# Altium footprint library SMDLibrary.PcbLib: 309 footprints (part 2 of 20)
Each footprint in its own frame and in the unit in brackets; x right, y up, seen from the top. Pads: shape width x height; smd on the part's side, far side on the other; paste and mask are expansions set on the pad; w line width, h text height; cw(c..) or ccw(c..) is an arc to the next point about the centre after c.
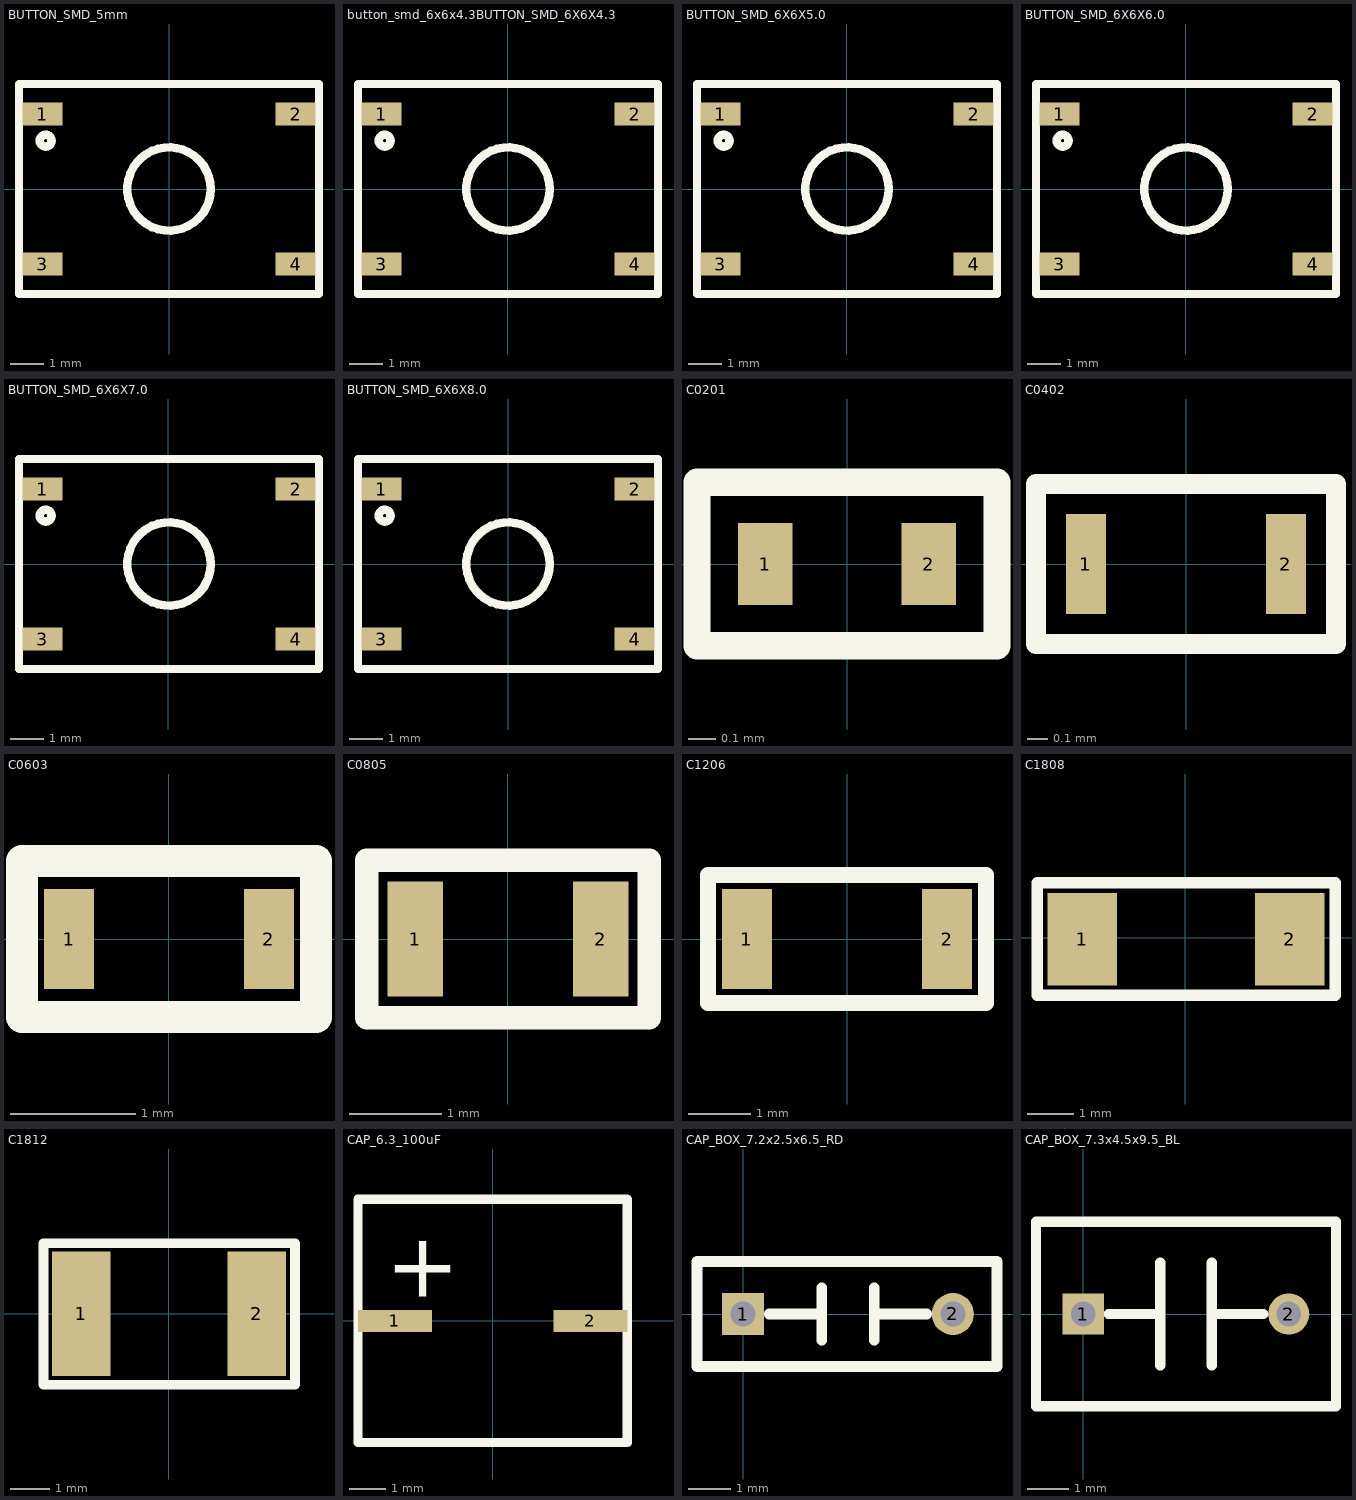
[diagram p1: the footprints below, top view; thin cyan lines are the x and y axes]

## BUTTON_SMD_5mm [mm]
pads (4):
  rect 1.2x0.7 smd: 1(-3.8,2.25) 2(3.8,2.25) 3(-3.8,-2.25) 4(3.8,-2.25)
Top Overlay:
  circle w0.254: c-3.7,1.45 r0.177
  circle w0.254: c0,0 r1.25
  lines w0.254: -4.5,-3.15 -4.5,3.15 4.5,3.15 4.5,-3.15 -4.5,-3.15
3D body "button_smd_6x6x4.3.stp": height 4.3, standoff 0, extent -4,-3 4,3

## button_smd_6x6x4.3BUTTON_SMD_6X6X4.3 [mm]
pads (4):
  rect 1.2x0.7 smd: 1(-3.8,2.25) 2(3.8,2.25) 3(-3.8,-2.25) 4(3.8,-2.25)
Top Overlay:
  circle w0.254: c-3.7,1.45 r0.177
  circle w0.254: c0,0 r1.25
  lines w0.254: -4.5,-3.15 -4.5,3.15 4.5,3.15 4.5,-3.15 -4.5,-3.15
3D body "button_smd_6x6x4.3.stp": height 4.3, standoff 0, extent -4,-3 4,3

## BUTTON_SMD_6X6X5.0 [mm]
pads (4):
  rect 1.2x0.7 smd: 1(-3.8,2.25) 2(3.8,2.25) 3(-3.8,-2.25) 4(3.8,-2.25)
Top Overlay:
  circle w0.254: c0,0 r1.25
  circle w0.254: c-3.7,1.45 r0.177
  lines w0.254: -4.5,-3.15 4.5,-3.15 4.5,3.15 -4.5,3.15 -4.5,-3.15
3D body "button_smd_6x6x5.0.stp": height 5, standoff 0, extent -4,-3 4,3

## BUTTON_SMD_6X6X6.0 [mm]
pads (4):
  rect 1.2x0.7 smd: 1(-3.8,2.25) 2(3.8,2.25) 3(-3.8,-2.25) 4(3.8,-2.25)
Top Overlay:
  circle w0.254: c0,0 r1.25
  circle w0.254: c-3.7,1.45 r0.177
  lines w0.254: -4.5,-3.15 4.5,-3.15 4.5,3.15 -4.5,3.15 -4.5,-3.15
3D body "button_smd_6x6x6.0.stp": height 6, standoff 0, extent -4.025,-3 3.975,3

## BUTTON_SMD_6X6X7.0 [mm]
pads (4):
  rect 1.2x0.7 smd: 1(-3.775,2.25) 2(3.825,2.25) 3(-3.775,-2.25) 4(3.825,-2.25)
Top Overlay:
  circle w0.254: c0.025,0 r1.25
  circle w0.254: c-3.675,1.45 r0.177
  lines w0.254: -4.475,-3.15 4.525,-3.15 4.525,3.15 -4.475,3.15 -4.475,-3.15
3D body "button_smd_6x6x7.0.stp": height 7, standoff 0, extent -3.975,-3.025 4.025,2.975

## BUTTON_SMD_6X6X8.0 [mm]
pads (4):
  rect 1.2x0.7 smd: 1(-3.8,2.25) 2(3.8,2.25) 3(-3.8,-2.25) 4(3.8,-2.25)
Top Overlay:
  circle w0.254: c0,0 r1.25
  circle w0.254: c-3.7,1.45 r0.177
  lines w0.254: -4.5,-3.15 4.5,-3.15 4.5,3.15 -4.5,3.15 -4.5,-3.15
3D body "button_smd_6x6x8.0.stp": height 8, standoff 0, extent -4,-3 4,3

## C0201 [mm]
pads (2):
  rect 0.2x0.3 smd: 1(-0.3,0) 2(0.3,0)
Top Overlay:
  lines w0.1: -0.55,-0.3 -0.55,0.3 0.55,0.3 0.55,-0.3 -0.55,-0.3
3D body "User Library-SMD CAPACITOR.STEP": height 0.27, standoff -0.03, extent -0.3,-0.15 0.3,0.15

## C0402 [mm]
pads (2):
  rect 0.2x0.5 smd: 1(-0.5,0) 2(0.5,0)
Top Overlay:
  lines w0.1: -0.75,-0.4 0.75,-0.4 0.75,0.4 -0.75,0.4 -0.75,-0.4
3D body "User Library-SMD CAPACITOR0402.STEP": height 0.48, standoff -0.02, extent -0.5,-0.25 0.5,0.25

## C0603 [mm]
pads (2):
  rect 0.4x0.8 smd: 1(-0.8,0) 2(0.8,0)
Top Overlay:
  lines w0.254: -1.175,-0.625 -1.175,0.625 1.175,0.625 1.175,-0.625 -1.175,-0.625
3D body "User Library-SMD CAPACITOR0603.STEP": height 0.78, standoff -0.02, extent -0.8,-0.4 0.8,0.4

## C0805 [mm]
pads (2):
  rect 0.6x1.24 smd: 1(-1,0) 2(1,0)
Top Overlay:
  lines w0.254: -1.525,-0.85 -1.525,0.85 1.525,0.85 1.525,-0.85 -1.525,-0.85
3D body "CAPC0805 v2.step": height 1, standoff 0, extent -1,-0.6 1,0.6

## C1206 [mm]
pads (2):
  rect 0.8x1.6 smd: 1(-1.6,0) 2(1.6,0)
Top Overlay:
  lines w0.254: -2.225,-1.025 -2.225,1.025 2.225,1.025 2.225,-1.025 -2.225,-1.025
3D body "User Library-SMD CAPACITOR1206.STEP": height 0.75, standoff -0.03, extent -1.6,-0.8 1.6,0.8

## C1808 [mm]
pads (2):
  rect 1.5x2 smd: 1(-2.23,-0.031) 2(2.27,-0.031)
Top Overlay:
  lines w0.254: -3.2,-1.245 -3.2,1.194 3.251,1.194 3.251,-1.245 -3.2,-1.245
3D body "User Library-SMD CAPACITOR1808.STEP": height 0.89, standoff -0.01, extent -2.23,-1.031 2.27,0.969

## C1812 [mm]
pads (2):
  rect 1.5x3.2 smd: 1(-2.25,0) 2(2.25,0)
Top Overlay:
  lines w0.254: -3.219,-1.823 -3.219,1.809 3.233,1.809 3.233,-1.823 -3.219,-1.823
3D body "User Library-SMD CAPACITOR1812.STEP": height 0.97, standoff -0.03, extent -2.25,-1.6 2.25,1.6

## CAP_6.3_100uF [mm]
pads (2):
  rect 2x0.6 smd: 1(-2.65,0) 2(2.65,0)
Top Overlay:
  pour cut-out: 4.483,3.67
  lines w0.254: -3.65,-3.3 -3.65,3.3 3.65,3.3 3.65,-3.3 -3.65,-3.3
  text "+" at -2.9,0.075 h3
3D body "User Library-SMD Polymer Aluminum Electrolytic Capacitors C6 100uF 6,3V.STEP": height 5.9, standoff -0.05, extent -3.65,-3.3 3.65,3.3

## CAP_BOX_7.2x2.5x6.5_RD [mm]
pads (2):
  rect 1x1 hole 0.6: 1(0,0)
  round 1 hole 0.6: 2(5,0)
Top Overlay:
  lines w0.254: 0.625,0 1.875,0 ; 1.875,-0.625 1.875,0.625 ; 3.125,-0.625 3.125,0.625 ; 3.125,0 4.375,0 ; -1.1,-1.25 -1.1,1.25 6.05,1.25 6.05,-1.25 -1.1,-1.25
3D body "CAP_BOX_7.2x2.5x6.5_RD.stp": height 6.5, standoff -2.5, extent -1.1,-1.25 6.1,1.25

## CAP_BOX_7.3x4.5x9.5_BL [mm]
pads (2):
  rect 1x1 hole 0.6: 1(0,0)
  round 1 hole 0.6: 2(5,0)
Top Overlay:
  lines w0.254: 0.625,0 1.875,0 ; 1.875,-1.25 1.875,1.25 ; 3.125,-1.25 3.125,1.25 ; 3.125,0 4.375,0 ; -1.15,-2.25 -1.15,2.25 6.15,2.25 6.15,-2.25 -1.15,-2.25
3D body "CAP_BOX_7.3x4.5x9.5_BL.stp": height 9.5, standoff -2.5, extent -1.15,-2.25 6.15,2.25